# Altium footprint library Custom_Library.PcbLib: 221 footprints (part 3 of 14)
Each footprint in its own frame and in the unit in brackets; x right, y up, seen from the top. Pads: shape width x height; smd on the part's side, far side on the other; paste and mask are expansions set on the pad; w line width, h text height; cw(c..) or ccw(c..) is an arc to the next point about the centre after c.
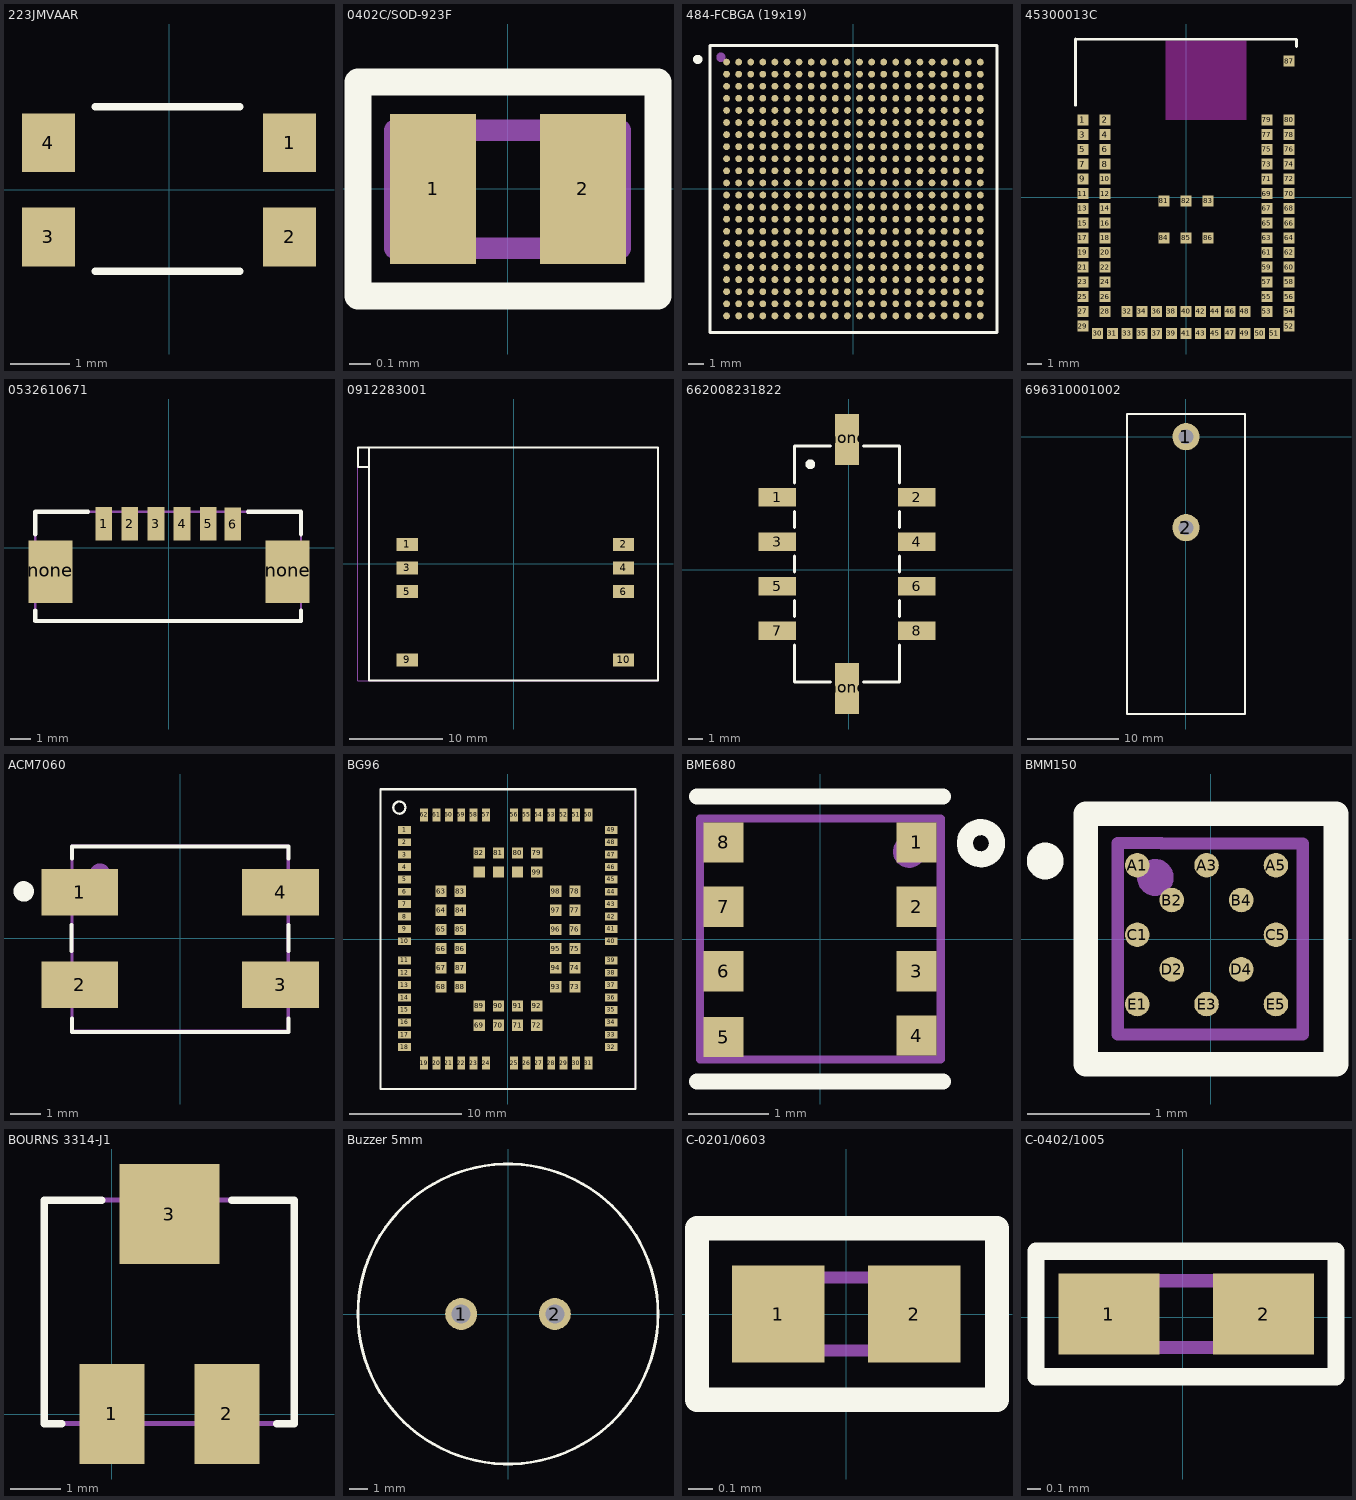
[diagram p2: the footprints below, top view; thin cyan lines are the x and y axes]

## 223JMVAAR [mm]
pads (4):
  rect 0.9x1 smd: 1(2.05,0.8) 2(2.05,-0.8) 3(-2.05,-0.8) 4(-2.05,0.8)
Top Overlay:
  lines w0.127: -1.252,-1.384 1.2,-1.384 ; -1.252,1.414 1.2,1.414
3D body "Part1.STEP": height 1.9, standoff 0, extent -2.075,-1.392 2.125,1.408

## 0402C/SOD-923F [mm]
pads (2):
  rect 0.4x0.7 smd mask+0.05: 1(-0.35,0) 2(0.35,0)
Top Overlay:
  lines w0.127: -0.7,-0.5 -0.7,0.499 0.7,0.499 0.7,-0.5 -0.7,-0.5
Top Assembly:
  lines w0.1: -0.528,-0.277 -0.528,0.058 -0.528,0.274 0.524,0.274 0.524,-0.277 -0.528,-0.277
  text "'.Designator'" at -3.144,-1.524 h1.27
3D body: height 0.45, standoff 0, extent -0.535,-0.275 0.515,0.275

## 484-FCBGA (19x19) [mm]
pads (484):
  round 0.45 smd: A1(-8.4,8.4) A2(-7.6,8.4) A3(-6.8,8.4) A4(-6,8.4) A5(-5.2,8.4) A6(-4.4,8.4) A7(-3.6,8.4) A8(-2.8,8.4) A9(-2,8.4) A10(-1.2,8.4) A11(-0.4,8.4) A12(0.4,8.4) A13(1.2,8.4) A14(2,8.4) A15(2.8,8.4) A16(3.6,8.4) A17(4.4,8.4) A18(5.2,8.4) A19(6,8.4) A20(6.8,8.4) A21(7.6,8.4) A22(8.4,8.4) AA1(-8.4,-7.6) AA2(-7.6,-7.6) AA3(-6.8,-7.6) AA4(-6,-7.6) AA5(-5.2,-7.6) AA6(-4.4,-7.6) AA7(-3.6,-7.6) AA8(-2.8,-7.6) AA9(-2,-7.6) AA10(-1.2,-7.6) AA11(-0.4,-7.6) AA12(0.4,-7.6) AA13(1.2,-7.6) AA14(2,-7.6) AA15(2.8,-7.6) AA16(3.6,-7.6) AA17(4.4,-7.6) AA18(5.2,-7.6) AA19(6,-7.6) AA20(6.8,-7.6) AA21(7.6,-7.6) AA22(8.4,-7.6) AB1(-8.4,-8.4) AB2(-7.6,-8.4) AB3(-6.8,-8.4) AB4(-6,-8.4) AB5(-5.2,-8.4) AB6(-4.4,-8.4) AB7(-3.6,-8.4) AB8(-2.8,-8.4) AB9(-2,-8.4) AB10(-1.2,-8.4) AB11(-0.4,-8.4) AB12(0.4,-8.4) AB13(1.2,-8.4) AB14(2,-8.4) AB15(2.8,-8.4) AB16(3.6,-8.4) AB17(4.4,-8.4) AB18(5.2,-8.4) AB19(6,-8.4) AB20(6.8,-8.4) AB21(7.6,-8.4) AB22(8.4,-8.4) B1(-8.4,7.6) B2(-7.6,7.6) B3(-6.8,7.6) B4(-6,7.6) B5(-5.2,7.6) B6(-4.4,7.6) B7(-3.6,7.6) B8(-2.8,7.6) B9(-2,7.6) B10(-1.2,7.6) B11(-0.4,7.6) B12(0.4,7.6) B13(1.2,7.6) B14(2,7.6) B15(2.8,7.6) B16(3.6,7.6) B17(4.4,7.6) B18(5.2,7.6) B19(6,7.6) B20(6.8,7.6) B21(7.6,7.6) B22(8.4,7.6) C1(-8.4,6.8) C2(-7.6,6.8) C3(-6.8,6.8) C4(-6,6.8) C5(-5.2,6.8) C6(-4.4,6.8) C7(-3.6,6.8) C8(-2.8,6.8) C9(-2,6.8) C10(-1.2,6.8) C11(-0.4,6.8) C12(0.4,6.8) C13(1.2,6.8) C14(2,6.8) C15(2.8,6.8) C16(3.6,6.8) C17(4.4,6.8) C18(5.2,6.8) C19(6,6.8) C20(6.8,6.8) C21(7.6,6.8) C22(8.4,6.8) D1(-8.4,6) D2(-7.6,6) D3(-6.8,6) D4(-6,6) D5(-5.2,6) D6(-4.4,6) D7(-3.6,6) D8(-2.8,6) D9(-2,6) D10(-1.2,6) D11(-0.4,6) D12(0.4,6) D13(1.2,6) D14(2,6) D15(2.8,6) D16(3.6,6) D17(4.4,6) D18(5.2,6) D19(6,6) D20(6.8,6) D21(7.6,6) D22(8.4,6) E1(-8.4,5.2) E2(-7.6,5.2) E3(-6.8,5.2) E4(-6,5.2) E5(-5.2,5.2) E6(-4.4,5.2) E7(-3.6,5.2) E8(-2.8,5.2) E9(-2,5.2) E10(-1.2,5.2) E11(-0.4,5.2) E12(0.4,5.2) E13(1.2,5.2) E14(2,5.2) E15(2.8,5.2) E16(3.6,5.2) E17(4.4,5.2) E18(5.2,5.2) E19(6,5.2) E20(6.8,5.2) E21(7.6,5.2) E22(8.4,5.2) F1(-8.4,4.4) F2(-7.6,4.4) F3(-6.8,4.4) F4(-6,4.4) F5(-5.2,4.4) F6(-4.4,4.4) F7(-3.6,4.4) F8(-2.8,4.4) F9(-2,4.4) F10(-1.2,4.4) F11(-0.4,4.4) F12(0.4,4.4) F13(1.2,4.4) F14(2,4.4) F15(2.8,4.4) F16(3.6,4.4) F17(4.4,4.4) F18(5.2,4.4) F19(6,4.4) F20(6.8,4.4) F21(7.6,4.4) F22(8.4,4.4) G1(-8.4,3.6) G2(-7.6,3.6) G3(-6.8,3.6) G4(-6,3.6) G5(-5.2,3.6) G6(-4.4,3.6) G7(-3.6,3.6) G8(-2.8,3.6) G9(-2,3.6) G10(-1.2,3.6) G11(-0.4,3.6) G12(0.4,3.6) G13(1.2,3.6) G14(2,3.6) G15(2.8,3.6) G16(3.6,3.6) G17(4.4,3.6) G18(5.2,3.6) G19(6,3.6) G20(6.8,3.6) G21(7.6,3.6) G22(8.4,3.6) H1(-8.4,2.8) H2(-7.6,2.8) H3(-6.8,2.8) H4(-6,2.8) H5(-5.2,2.8) H6(-4.4,2.8) H7(-3.6,2.8) H8(-2.8,2.8) H9(-2,2.8) H10(-1.2,2.8) H11(-0.4,2.8) H12(0.4,2.8) H13(1.2,2.8) H14(2,2.8) H15(2.8,2.8) H16(3.6,2.8) H17(4.4,2.8) H18(5.2,2.8) H19(6,2.8) H20(6.8,2.8) H21(7.6,2.8) H22(8.4,2.8) J1(-8.4,2) J2(-7.6,2) J3(-6.8,2) J4(-6,2) J5(-5.2,2) J6(-4.4,2) J7(-3.6,2) J8(-2.8,2) J9(-2,2) J10(-1.2,2) J11(-0.4,2) J12(0.4,2) J13(1.2,2) J14(2,2) J15(2.8,2) J16(3.6,2) J17(4.4,2) J18(5.2,2) J19(6,2) J20(6.8,2) J21(7.6,2) J22(8.4,2) K1(-8.4,1.2) K2(-7.6,1.2) K3(-6.8,1.2) K4(-6,1.2) K5(-5.2,1.2) K6(-4.4,1.2) K7(-3.6,1.2) K8(-2.8,1.2) K9(-2,1.2) K10(-1.2,1.2) K11(-0.4,1.2) K12(0.4,1.2) K13(1.2,1.2) K14(2,1.2) K15(2.8,1.2) K16(3.6,1.2) K17(4.4,1.2) K18(5.2,1.2) K19(6,1.2) K20(6.8,1.2) K21(7.6,1.2) K22(8.4,1.2) L1(-8.4,0.4) L2(-7.6,0.4) L3(-6.8,0.4) L4(-6,0.4) L5(-5.2,0.4) L6(-4.4,0.4) L7(-3.6,0.4) L8(-2.8,0.4) L9(-2,0.4) L10(-1.2,0.4) L11(-0.4,0.4) L12(0.4,0.4) L13(1.2,0.4) L14(2,0.4) L15(2.8,0.4) L16(3.6,0.4) L17(4.4,0.4) L18(5.2,0.4) L19(6,0.4) L20(6.8,0.4) L21(7.6,0.4) L22(8.4,0.4) M1(-8.4,-0.4) M2(-7.6,-0.4) M3(-6.8,-0.4) M4(-6,-0.4) M5(-5.2,-0.4) M6(-4.4,-0.4) M7(-3.6,-0.4) M8(-2.8,-0.4) M9(-2,-0.4) M10(-1.2,-0.4) M11(-0.4,-0.4) M12(0.4,-0.4) M13(1.2,-0.4) M14(2,-0.4) M15(2.8,-0.4) M16(3.6,-0.4) M17(4.4,-0.4) M18(5.2,-0.4) M19(6,-0.4) M20(6.8,-0.4) M21(7.6,-0.4) M22(8.4,-0.4) N1(-8.4,-1.2) N2(-7.6,-1.2) N3(-6.8,-1.2) N4(-6,-1.2) N5(-5.2,-1.2) N6(-4.4,-1.2) N7(-3.6,-1.2) N8(-2.8,-1.2) N9(-2,-1.2) N10(-1.2,-1.2) N11(-0.4,-1.2) N12(0.4,-1.2) N13(1.2,-1.2) N14(2,-1.2) N15(2.8,-1.2) N16(3.6,-1.2) N17(4.4,-1.2) N18(5.2,-1.2) N19(6,-1.2) N20(6.8,-1.2) N21(7.6,-1.2) N22(8.4,-1.2) P1(-8.4,-2) P2(-7.6,-2) P3(-6.8,-2) P4(-6,-2) P5(-5.2,-2) P6(-4.4,-2) P7(-3.6,-2) P8(-2.8,-2) P9(-2,-2) P10(-1.2,-2) P11(-0.4,-2) P12(0.4,-2) P13(1.2,-2) P14(2,-2) P15(2.8,-2) P16(3.6,-2) P17(4.4,-2) P18(5.2,-2) P19(6,-2) P20(6.8,-2) P21(7.6,-2) P22(8.4,-2) R1(-8.4,-2.8) R2(-7.6,-2.8) R3(-6.8,-2.8) R4(-6,-2.8) R5(-5.2,-2.8) R6(-4.4,-2.8) R7(-3.6,-2.8) R8(-2.8,-2.8) R9(-2,-2.8) R10(-1.2,-2.8) R11(-0.4,-2.8) R12(0.4,-2.8) R13(1.2,-2.8) R14(2,-2.8) R15(2.8,-2.8) R16(3.6,-2.8) R17(4.4,-2.8) R18(5.2,-2.8) R19(6,-2.8) R20(6.8,-2.8) R21(7.6,-2.8) R22(8.4,-2.8) T1(-8.4,-3.6) T2(-7.6,-3.6) T3(-6.8,-3.6) T4(-6,-3.6) T5(-5.2,-3.6) T6(-4.4,-3.6) T7(-3.6,-3.6) T8(-2.8,-3.6) T9(-2,-3.6) T10(-1.2,-3.6) T11(-0.4,-3.6) T12(0.4,-3.6) T13(1.2,-3.6) T14(2,-3.6) T15(2.8,-3.6) T16(3.6,-3.6) T17(4.4,-3.6) T18(5.2,-3.6) T19(6,-3.6) T20(6.8,-3.6) T21(7.6,-3.6) T22(8.4,-3.6) U1(-8.4,-4.4) U2(-7.6,-4.4) U3(-6.8,-4.4) U4(-6,-4.4) U5(-5.2,-4.4) U6(-4.4,-4.4) U7(-3.6,-4.4) U8(-2.8,-4.4) U9(-2,-4.4) U10(-1.2,-4.4) U11(-0.4,-4.4) U12(0.4,-4.4) U13(1.2,-4.4) U14(2,-4.4) U15(2.8,-4.4) U16(3.6,-4.4) U17(4.4,-4.4) U18(5.2,-4.4) U19(6,-4.4) U20(6.8,-4.4) U21(7.6,-4.4) U22(8.4,-4.4) V1(-8.4,-5.2) V2(-7.6,-5.2) V3(-6.8,-5.2) V4(-6,-5.2) V5(-5.2,-5.2) V6(-4.4,-5.2) V7(-3.6,-5.2) V8(-2.8,-5.2) V9(-2,-5.2) V10(-1.2,-5.2) V11(-0.4,-5.2) V12(0.4,-5.2) V13(1.2,-5.2) V14(2,-5.2) V15(2.8,-5.2) V16(3.6,-5.2) V17(4.4,-5.2) V18(5.2,-5.2) V19(6,-5.2) V20(6.8,-5.2) V21(7.6,-5.2) V22(8.4,-5.2) W1(-8.4,-6) W2(-7.6,-6) W3(-6.8,-6) W4(-6,-6) W5(-5.2,-6) W6(-4.4,-6) W7(-3.6,-6) W8(-2.8,-6) W9(-2,-6) W10(-1.2,-6) W11(-0.4,-6) W12(0.4,-6) W13(1.2,-6) W14(2,-6) W15(2.8,-6) W16(3.6,-6) W17(4.4,-6) W18(5.2,-6) W19(6,-6) W20(6.8,-6) W21(7.6,-6) W22(8.4,-6) Y1(-8.4,-6.8) Y2(-7.6,-6.8) Y3(-6.8,-6.8) Y4(-6,-6.8) Y5(-5.2,-6.8) Y6(-4.4,-6.8) Y7(-3.6,-6.8) Y8(-2.8,-6.8) Y9(-2,-6.8) Y10(-1.2,-6.8) Y11(-0.4,-6.8) Y12(0.4,-6.8) Y13(1.2,-6.8) Y14(2,-6.8) Y15(2.8,-6.8) Y16(3.6,-6.8) Y17(4.4,-6.8) Y18(5.2,-6.8) Y19(6,-6.8) Y20(6.8,-6.8) Y21(7.6,-6.8) Y22(8.4,-6.8)
Top Overlay:
  circle w0.508: c-10.306,8.578 r0.051
  lines w0.2: -9.5,-9.5 9.5,-9.5 9.5,9.5 -9.5,9.5 -9.5,-9.5
Top Assembly:
  circle w0.508: c-8.773,8.719 r0.051
  lines w0.1: -9.5,-9.503 9.501,-9.503 9.501,9.488 -9.5,9.488 -9.5,-9.503
  text "'.Designator'" at -3.659,-11.119 h1.27
Mechanical 13:
  circle w0.127: c-8.4,8.4 r0.1
  lines w0.127: -9.5,-9.5 9.5,-9.5 9.5,9.5 -9.5,9.5 -9.5,-9.5

## 45300013C [mm]
pads (87):
  rect 0.75x0.75 smd: 1(-7,5.25) 2(-5.5,5.25) 3(-7,4.25) 4(-5.5,4.25) 5(-7,3.25) 6(-5.5,3.25) 7(-7,2.25) 8(-5.5,2.25) 9(-7,1.25) 10(-5.5,1.25) 11(-7,0.25) 12(-5.5,0.25) 13(-7,-0.75) 14(-5.5,-0.75) 15(-7,-1.75) 16(-5.5,-1.75) 17(-7,-2.75) 18(-5.5,-2.75) 19(-7,-3.75) 20(-5.5,-3.75) 21(-7,-4.75) 22(-5.5,-4.75) 23(-7,-5.75) 24(-5.5,-5.75) 25(-7,-6.75) 26(-5.5,-6.75) 27(-7,-7.75) 28(-5.5,-7.75) 29(-7,-8.75) 30(-6,-9.25) 31(-5,-9.25) 32(-4,-7.75) 33(-4,-9.25) 34(-3,-7.75) 35(-3,-9.25) 36(-2,-7.75) 37(-2,-9.25) 38(-1,-7.75) 39(-1,-9.25) 40(0,-7.75) 41(0,-9.25) 42(1,-7.75) 43(1,-9.25) 44(2,-7.75) 45(2,-9.25) 46(3,-7.75) 47(3,-9.25) 48(4,-7.75) 49(4,-9.25) 50(5,-9.25) 51(6,-9.25) 52(7,-8.75) 53(5.5,-7.75) 54(7,-7.75) 55(5.5,-6.75) 56(7,-6.75) 57(5.5,-5.75) 58(7,-5.75) 59(5.5,-4.75) 60(7,-4.75) 61(5.5,-3.75) 62(7,-3.75) 63(5.5,-2.75) 64(7,-2.75) 65(5.5,-1.75) 66(7,-1.75) 67(5.5,-0.75) 68(7,-0.75) 69(5.5,0.25) 70(7,0.25) 71(5.5,1.25) 72(7,1.25) 73(5.5,2.25) 74(7,2.25) 75(5.5,3.25) 76(7,3.25) 77(5.5,4.25) 78(7,4.25) 79(5.5,5.25) 80(7,5.25) 81(-1.5,-0.25) 82(0,-0.25) 83(1.5,-0.25) 84(-1.5,-2.75) 85(0,-2.75) 86(1.5,-2.75) 87(7,9.25)
Top Overlay:
  lines w0.2: -7.5,6.25 -7.5,10.75 7.5,10.73 7.5,10.25
Keep-Out Layer:
  rectangle: -1.4,5.25 4.12,10.65

## 0532610671 [mm]
pads (8):
  rect 0.8x1.6 smd: 1(-3.125,1.15) 2(-1.875,1.15) 3(-0.625,1.15) 4(0.625,1.15) 5(1.875,1.15) 6(3.05,1.138)
  rect 2.1x3 smd: none(-5.675,-1.15) none(5.675,-1.15)
Top Overlay:
  lines w0.2: -6.398,-2.999 -6.398,-3.499 5.449,-3.499 6.311,-3.499 6.311,-3.037 6.311,-2.999 ; -6.398,0.65 -6.398,1.362 -6.398,1.725 -3.874,1.725 ; 3.774,1.725 6.311,1.725 6.311,0.962 6.311,0.65
Top Assembly:
  lines w0.1: -6.398,-3.499 5.087,-3.499 6.311,-3.499 6.311,-0.525 6.311,1.725 -6.398,1.725 -6.398,-3.499
  text "'.Designator'" at -3.223,-1.884 h1.27
3D body "532610671.STEP": height 3.4, standoff 0, extent -6.351,-3.493 6.299,1.707

## 0912283001 [mm]
pads (8):
  rect 2.3x1.4 smd mask+0.15: 1(-11.4,2.1) 2(11.8,2.1) 3(-11.4,-0.44) 4(11.8,-0.44) 5(-11.4,-2.98) 6(11.8,-2.98) 9(-11.4,-10.3) 10(11.8,-10.3)
Top Overlay:
  lines w0.2: -15.5,10.4 -15.5,-12.5 15.5,-12.5 15.5,12.5 -15.5,12.5 ; -15.5,10.4 -16.7,10.4 -16.7,12.5 -15.5,12.5 ; -15.5,10.4 -15.5,12.5
Top Assembly:
  lines w0.1: -16.7,-12.53 15.5,-12.53 15.5,12.5 -16.7,12.5 -16.7,-12.53
  text "'.Designator'" at -1.512,0.784 h1.27
3D body "91228-3001--3DModel-STEP-56544.STEP": height 3.1, standoff 0, extent -16.71,-12.48 15.49,12.52

## 662008231822 [mm]
pads (10):
  rect 2.54x1.27 smd mask+0.152: 1(-4.827,4.881) 2(4.573,4.881) 3(-4.827,1.881) 4(4.573,1.881) 5(-4.827,-1.119) 6(4.573,-1.119) 7(-4.827,-4.119) 8(4.573,-4.119)
  rect 1.65x3.43 smd mask+0.152: none(-0.127,-8.014) none(-0.127,8.776)
Top Overlay:
  circle w0.356: c-2.6,7.1 r0.152
  lines w0.2: -3.657,-5.069 -3.657,-7.569 -1.247,-7.569 ; -3.657,-3.169 -3.657,-2.069 ; -3.657,-0.169 -3.657,0.931 ; -3.657,2.831 -3.657,3.931 ; -3.657,5.831 -3.657,8.331 -1.247,8.331 ; 0.993,-7.569 3.403,-7.569 3.403,-5.069 ; 0.993,8.331 3.403,8.331 3.403,5.831 ; 3.403,-3.169 3.403,-2.069 ; 3.403,-0.169 3.403,0.931 ; 3.403,2.831 3.403,3.931

## 696310001002 [mm]
pads (2):
  round 3 hole 1.6 mask+0.05: 1(0,0) 2(0,-10)
Top Overlay:
  lines w0.2: -6.498,-30.5 6.502,-30.5 6.502,2.5 -6.498,2.5 -6.498,-30.5
3D body: height 13, standoff 0, extent -6.498,-30.5 6.502,2.5

## ACM7060 [mil]
pads (4):
  rect 98x59 smd: 1(-128,59.06) 2(-128,-59.06) 3(128,-59.06) 4(128,59.06)
Top Overlay:
  circle w14: c-199.49,60.04 r6
  lines w5: -138.29,-15.94 -138.29,16.97 ; -137.78,-101.66 -137.78,-119.4 138.04,-119.4 138.04,-101.66 ; -137.78,101.66 -137.78,117.16 138.04,117.16 138.04,101.66 ; 138.04,-15.68 138.04,17.23
Top Assembly:
  circle w14: c-102.36,82.68 r6
  lines w3.94: -137.8,-118.11 137.8,-118.11 137.8,118.11 -102.36,118.11 -137.8,118.11 -137.8,-118.11
  text "'.Designator'" at -138.82,-190.84 h50
3D body "aaa.STEP": height 132.87, standoff 0.98, extent -137.8,-118.11 137.8,118.11

## BG96 [mm]
pads (102):
  rect 1.15x0.7 smd paste-2: 1(-9.18,9.7) 2(-9.18,8.6) 3(-9.18,7.5) 4(-9.18,6.4) 5(-9.18,5.3) 6(-9.18,4.2) 7(-9.18,3.1) 8(-9.18,2) 9(-9.18,0.9) 10(-9.18,-0.2) 11(-9.18,-1.9) 12(-9.18,-3) 13(-9.18,-4.1) 14(-9.18,-5.2) 15(-9.18,-6.3) 16(-9.18,-7.4) 17(-9.18,-8.5) 18(-9.18,-9.6) 32(9.18,-9.6) 33(9.18,-8.5) 34(9.18,-7.4) 35(9.18,-6.3) 36(9.18,-5.2) 37(9.18,-4.1) 38(9.18,-3) 39(9.18,-1.9) 40(9.18,-0.2) 41(9.18,0.9) 42(9.18,2) 43(9.18,3.1) 44(9.18,4.2) 45(9.18,5.3) 46(9.18,6.4) 47(9.18,7.5) 48(9.18,8.6) 49(9.18,9.7)
  rect 0.7x1.15 smd paste-2: 19(-7.45,-11.03) 20(-6.35,-11.03) 21(-5.25,-11.03) 22(-4.15,-11.03) 23(-3.05,-11.03) 24(-1.95,-11.03) 25(0.55,-11.03) 26(1.65,-11.03) 27(2.75,-11.03) 28(3.85,-11.03) 29(4.95,-11.03) 30(6.05,-11.03) 31(7.15,-11.03) 50(7.15,11.03) 51(6.05,11.03) 52(4.95,11.03) 53(3.85,11.03) 54(2.75,11.03) 55(1.65,11.03) 56(0.55,11.03) 57(-1.95,11.03) 58(-3.05,11.03) 59(-4.15,11.03) 60(-5.25,11.03) 61(-6.35,11.03) 62(-7.45,11.03)
  rect 1x1 smd paste-1: 63(-5.95,4.25) 64(-5.95,2.55) 65(-5.95,0.85) 66(-5.95,-0.85) 67(-5.95,-2.55) 68(-5.95,-4.25) 69(-2.55,-7.65) 70(-0.85,-7.65) 71(0.85,-7.65) 72(2.55,-7.65) 73(5.95,-4.25) 74(5.95,-2.55) 75(5.95,-0.85) 76(5.95,0.85) 77(5.95,2.55) 78(5.95,4.25) 79(2.55,7.65) 80(0.85,7.65) 81(-0.85,7.65) 82(-2.55,7.65) 83(-4.25,4.25) 84(-4.25,2.55) 85(-4.25,0.85) 86(-4.25,-0.85) 87(-4.25,-2.55) 88(-4.25,-4.25) 89(-2.55,-5.95) 90(-0.85,-5.95) 91(0.85,-5.95) 92(2.55,-5.95) 93(4.25,-4.25) 94(4.25,-2.55) 95(4.25,-0.85) 96(4.25,0.85) 97(4.25,2.55) 98(4.25,4.25) 99(2.55,5.95) 100(0.85,5.95) 101(-0.85,5.95) 102(-2.55,5.95)
Top Overlay:
  circle w0.2: c-9.652,11.684 r0.539
  lines w0.2: -11.325,-13.325 -11.325,13.325 11.325,13.325 11.325,-13.325 -11.325,-13.325
Top Paste:
  drawing of 104 lines, arcs and shapes, not listed
Top Assembly:
  lines w0.1: -11.319,-13.327 11.327,-13.327 11.327,13.337 -11.319,13.337 -11.319,-13.327
  text "'.Designator'" at -3.243,-0.316 h1.27
3D body "step_temp.STEP": height 2.3, standoff 0, extent -11.25,-13.25 11.25,13.25

## BME680 [mm]
pads (8):
  rect 0.5x0.5 smd: 1(1.2,1.2) 2(1.2,0.4) 3(1.2,-0.4) 4(1.2,-1.2) 5(-1.2,-1.22) 6(-1.2,-0.4) 7(-1.2,0.4) 8(-1.2,1.2)
Top Overlay:
  circle w0.2: c1.999,1.191 r0.2
  lines w0.2: -1.53,-1.77 1.53,-1.77 ; -1.53,1.77 1.53,1.77
Top Assembly:
  circle w0.2: c1.107,1.085 r0.1
  lines w0.1: -1.491,-1.5 0.1,-1.5 1.5,-1.5 1.5,-0.7 1.5,1.5 -0.1,1.5 -1.491,1.5 -1.491,0.209 -1.491,-1.5
  text "'.Designator'" at -3.281,-2.872 h1.27
3D body "BME680--3DModel-STEP-56544.STEP": height 1, standoff 0, extent -1.5,-1.5 1.5,1.5

## BMM150 [mm]
pads (12):
  round 0.2 smd: A1(-0.601,0.601) A3(-0.035,0.601) A5(0.531,0.601) B2(-0.318,0.318) B4(0.248,0.318) C1(-0.601,0.035) C5(0.531,0.035) D2(-0.318,-0.248) D4(0.248,-0.248) E1(-0.601,-0.531) E3(-0.035,-0.531) E5(0.531,-0.531)
Top Overlay:
  circle w0.15: c-1.351,0.636 r0.075
  lines w0.2: -1.021,-1.021 -1.021,0.62 -1.021,1.021 0.62,1.021 1.021,1.021 1.021,-0.62 1.021,-1.021 -0.62,-1.021 -1.021,-1.021
Top Assembly:
  circle w0.15: c-0.453,0.502 r0.075
  lines w0.1: -0.402,0.783 -0.76,0.783 -0.76,-0.14 -0.76,-0.78 0.08,-0.78 0.75,-0.78 0.75,0.19 0.75,0.78 -0.4,0.78
  text "'.Designator'" at -3.202,-2.134 h1.27
3D body: height 0.6, standoff 0, extent -0.78,-0.78 0.78,0.78

## BOURNS 3314-J1 [mm] "Bourns Trimpot 3302 - Open Frame 2.75mm x 2.20mm x 1.05mm"
height 1.05
pads (3):
  rect 1.3x2 smd: 1(0,0) 2(2.3,0)
  rect 2x2 smd: 3(1.15,4)
Top Overlay:
  lines w0.15: -1,-0.193 -1.354,-0.193 -1.354,1.946 -1.354,4.277 -0.2,4.277 ; 2.4,4.277 3.651,4.277 3.651,2.751 3.651,-0.193 3.3,-0.193
Top Assembly:
  lines w0.1: -1.363,-0.193 3.636,-0.193 3.636,4.277 -1.363,4.277 -1.363,-0.193
  text "'.Designator'" at -1.825,-2.078 h1.27
3D body "3314J1.STEP": height 2.74, standoff 0.01, extent -1.357,-0.45 3.642,4.554

## Buzzer 5mm [mm]
pads (2):
  round 1.7 hole 1 mask+0.05: 1(-2.5,0) 2(2.5,0)
Top Overlay:
  circle w0.15: c0,0 r8

## C-0201/0603 [mm]
pads (2):
  rect 0.38x0.4 smd: 1(-0.28,0) 2(0.28,0)
Top Overlay:
  lines w0.1: -0.614,-0.353 -0.614,0.353 0.621,0.353 0.621,-0.353 -0.614,-0.353
Top Assembly:
  lines w0.05: -0.302,-0.151 -0.302,0.151 0.3,0.151 0.3,-0.151 -0.302,-0.151
  text "'.Designator'" at -3.161,-1.371 h1.27
3D body "C0201_020.step": height 0.2, standoff 0, extent -0.3,-0.15 0.3,0.15

## C-0402/1005 [mm] "Chip Capacitor, 2-Leads, Body 1.02x0.51mm, IPC Medium Density"
height 0.52
pads (2):
  rect 0.75x0.6 smd: 1(-0.55,0.022) 2(0.6,0.022)
Top Overlay:
  lines w0.127: -1.09,-0.443 -1.09,0.489 1.137,0.489 1.137,-0.443 -1.09,-0.443
Top Assembly:
  lines w0.1: -0.478,-0.225 -0.478,0.271 0.524,0.271 0.524,-0.225 -0.478,-0.225
  text "'.Designator'" at -2.8,-1.6 h1.27
3D body "0402 cap.STEP": height 0.52, standoff 0, extent -0.483,-0.241 0.517,0.283